# Altium footprint library PVV.PcbLib: 88 footprints (part 3 of 6)
Each footprint in its own frame and in the unit in brackets; x right, y up, seen from the top. Pads: shape width x height; smd on the part's side, far side on the other; paste and mask are expansions set on the pad; w line width, h text height; cw(c..) or ccw(c..) is an arc to the next point about the centre after c.
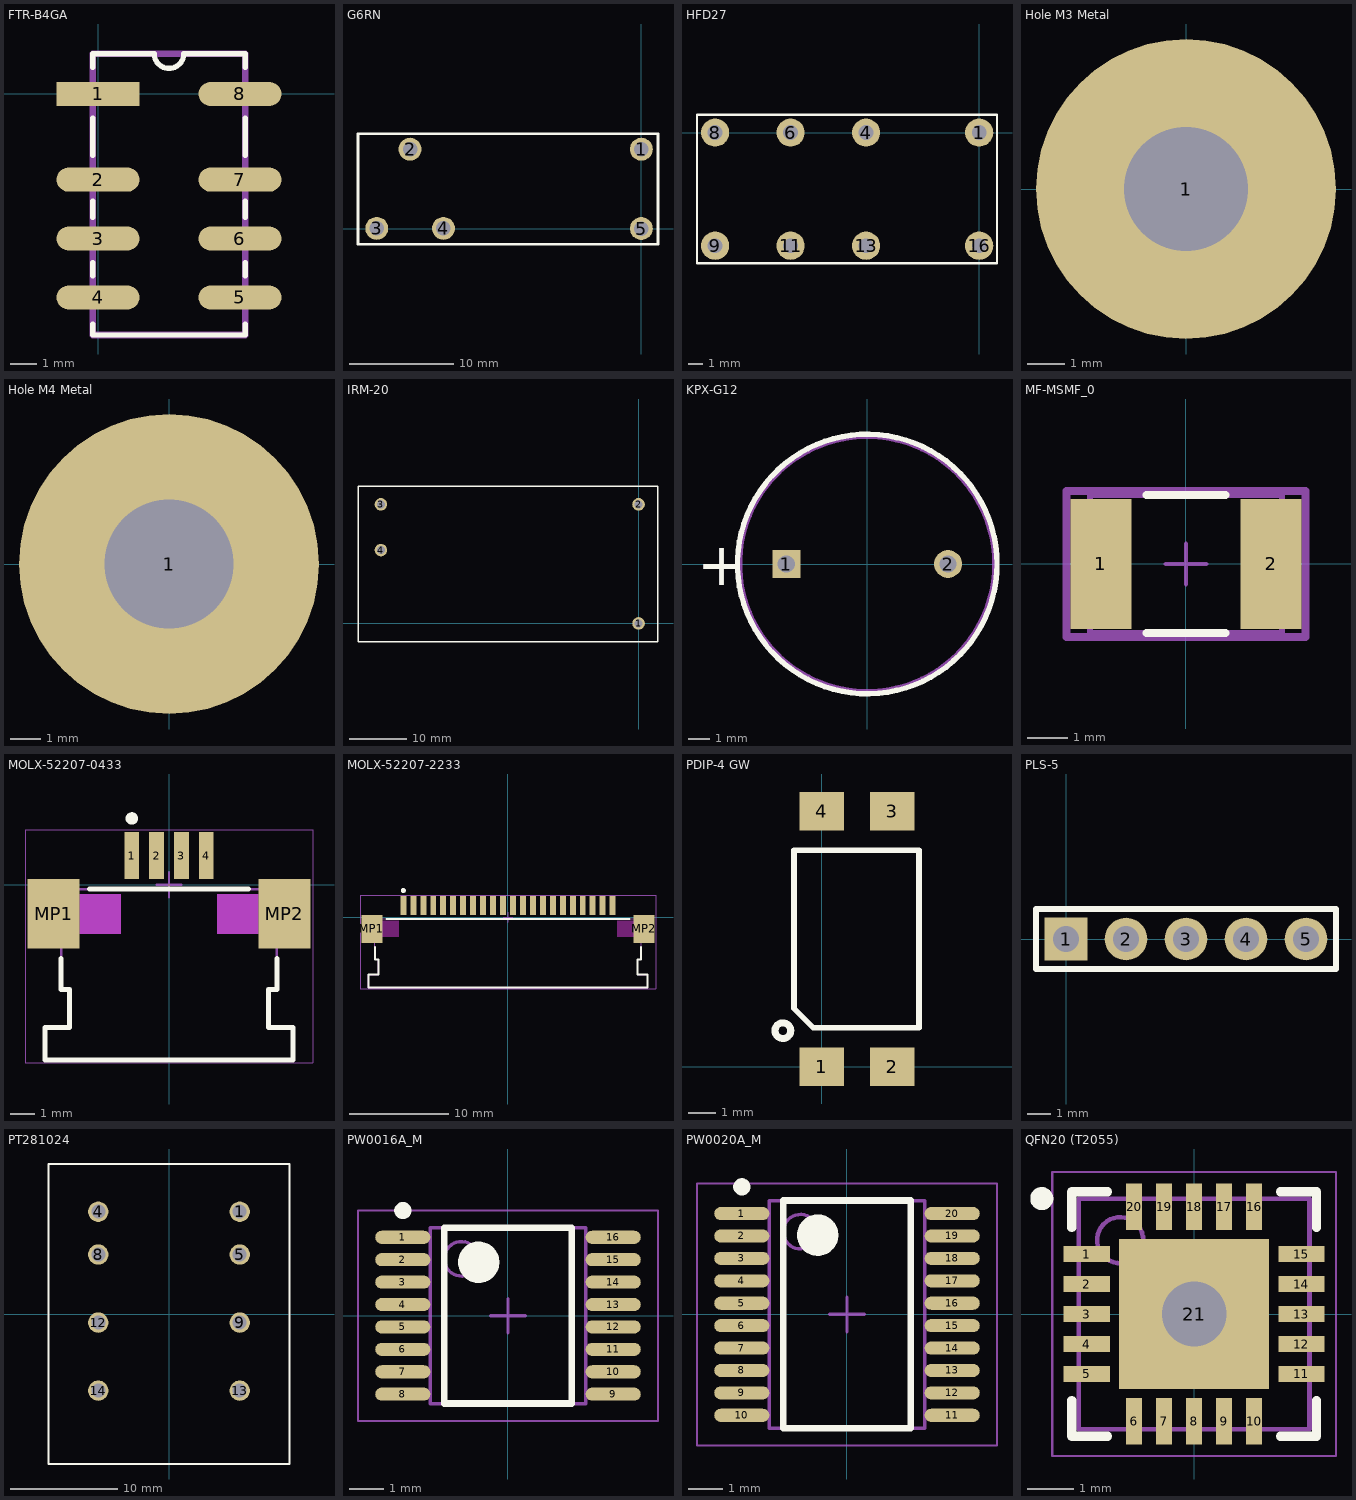
[diagram p2: the footprints below, top view; thin cyan lines are the x and y axes]

## FTR-B4GA [mm] "FTR-B4GA"
height 9.7
pads (8):
  rect 3.1x0.9 smd: 1(0,0)
  oval 3.1x0.9 smd: 2(0,-3.2) 3(0,-5.4) 4(0,-7.6) 5(5.3,-7.6) 6(5.3,-5.4) 7(5.3,-3.2) 8(5.3,0)
Top Overlay:
  lines w0.2: -0.2,-8.6 -0.2,-9 5.5,-9 5.5,-8.6 ; -0.2,-6.8 -0.2,-6.3 ; -0.2,-4.6 -0.2,-4 ; -0.2,-2.3 -0.2,-0.9 ; -0.2,1 -0.2,1.5 2.1,1.5 ccw(c2.65,1.5) 3.2,1.5 5.5,1.5 5.5,1 ; 5.5,-6.8 5.5,-6.3 ; 5.5,-4.6 5.5,-4 ; 5.5,-2.3 5.5,-0.9
Mechanical 13:
  lines w0.254: -0.2,-9 -0.2,1.5 5.5,1.5 5.5,-9 -0.2,-9
3D body: height 9.7, standoff 0, extent -0.199,-8.999 5.499,1.499

## G6RN [mm]
pads (5):
  round 2.2 hole 1.4: 1(0,7.62) 2(-22.2,7.62) 3(-25.4,0.02) 4(-19,0.02) 5(0,0)
Top Overlay:
  lines w0.254: -27.2,-1.5 -27.2,9.1 1.6,9.1 1.6,-1.5 -27.2,-1.5
3D body "User Library-Omron_G6RN-1-5DC_relay.step": height 15.31, standoff -3.49, extent -27.2,-1.44 1.6,9.06

## HFD27 [mm]
pads (8):
  round 1.9 hole 1: 1(0,0) 4(-7.62,0) 6(-12.7,0) 8(-17.78,0) 9(-17.78,-7.62) 11(-12.7,-7.62) 13(-7.62,-7.62) 16(0,-7.62)
Top Overlay:
  lines w0.152: -19,-8.8 1.2,-8.8 1.2,1.2 -19,1.2 -19,-8.8
3D body "SW3dPS-HFD27.STEP": height 11.52, standoff -3.09, extent -18.98,-8.81 1.22,1.19

## Hole M3 Metal [mm] "Hole 3.3 metal 8"
pads (1):
  round 8 hole 3.3: 1(0,0)

## Hole M4 Metal [mm] "Hole 4.3 metal 10"
pads (1):
  round 10 hole 4.3: 1(0,0)

## IRM-20 [mm] "20W PCB"
pads (4):
  round 2.2 hole 1.4: 1(0,0) 2(0,20.8) 3(-45,20.8) 4(-45,12.8)
Top Overlay:
  lines w0.254: -49,-3.2 -48.975,-3.225 3.4,-3.225 3.4,23.975 -49,23.975 -49,-3.2
3D body "User Library-IRM-20.step": height 24.01, standoff -3.49, extent -48.986,-3.214 3.414,23.986

## KPX-G12 [mil]
height 295.28
pads (2):
  rect 52x52 hole 32: 1(-149.61,0)
  round 52 hole 32: 2(149.61,0)
Top Overlay:
  circle w10: c0,0 r240.16
  text "+" at -314.96,-39.37 h78.74
Mechanical 13:
  circle w10: c0,0 r236.22
3D body: height 295.28, standoff 0, extent -236.2,-236.2 236.2,236.2

## MF-MSMF_0 [mm]
pads (2):
  rect 1.5x3.2 smd paste+0 mask+0: 1(-2.1,0) 2(2.1,0)
Top Overlay:
  lines w0.2: -0.975,-1.705 0.975,-1.705 ; -0.975,1.705 0.975,1.705
Mechanical 10:
  lines w0.2: -2.95,-1.805 -2.95,1.805 2.95,1.805 2.95,-1.805 -2.95,-1.805
  text ".Designator" at 0,0 h1
Mechanical 12:
  lines w0.15: -2.365,-1.705 -2.365,1.705 2.365,1.705 2.365,-1.705 -2.365,-1.705
Mechanical 15:
  lines w0.1: -0.5,0 0.5,0 ; 0,-0.5 0,0.5
  lines w0.2: -2.95,-1.805 -2.95,1.805 2.95,1.805 2.95,-1.805 -2.95,-1.805
3D body "Fuse_Bourns_MF-MSMF075-2_eec.STEP": height 0.25, standoff 0, extent -2.95,-1.805 2.95,1.805

## MOLX-52207-0433 [mm] "FPC Connector, 4-Leads, Right Angle, Pitch 1.0 mm, Mated Height 2.7 mm, SMT"
height 2.712
pads (6):
  rect 0.6x1.9 smd: 1(-1.5,1.175) 2(-0.5,1.175) 3(0.5,1.175) 4(1.5,1.175)
  rect 2.1x2.8 smd: MP1(-4.65,-1.175) MP2(4.65,-1.175)
Top Overlay:
  circle w0.25: c-1.5,2.675 r0.125
  lines w0.2: -4.35,-2.975 -4.35,-4.225 ; -3.2,-0.175 3.2,-0.175 ; 4.35,-2.975 4.35,-4.225 ; -4.35,-4.225 -4.35,-4.225 ; -4.35,-4.225 -4.013,-4.225 -4.012,-4.225 -4.012,-5.765 -5,-5.765 -5,-7.075 5,-7.075 5,-5.765 4.012,-5.765 4.012,-4.225 4.013,-4.225 4.35,-4.225 ; 4.35,-4.225 4.35,-4.225
Mechanical 13:
  lines w0.1: -5.15,-2.175 -4.35,-2.175 -4.35,-4.225 -4.012,-4.225 -4.012,-5.765 -5,-5.765 -5,-7.075 5,-7.075 5,-5.765 4.012,-5.765 4.012,-4.225 4.35,-4.225 4.35,-2.175 5.15,-2.175 5.15,-0.175 -5.15,-0.175 -5.15,-2.175
Mechanical 13 keep-out:
  region: -3.6,-0.375 -1.95,-0.375 -1.95,-1.975 -3.6,-1.975
  region: 3.6,-0.375 1.95,-0.375 1.95,-1.975 3.6,-1.975
Mechanical 15:
  lines w0.05: -5.8,-7.175 5.8,-7.175 5.8,2.225 -5.8,2.225 -5.8,-7.175
  lines w0.1: -0.5,0 0.5,0 ; 0,-0.5 0,0.5
3D body "522070433.stp": height 2.71, standoff 0.01, extent -5.15,-7.075 5.15,1.825

## MOLX-52207-2233 [mm] "FPC Connector, 22-Leads, Right Angle, Pitch 1.0 mm, Mated Height 2.7 mm, SMT"
height 2.712
pads (24):
  rect 0.6x1.9 smd: 1(-10.5,1.175) 2(-9.5,1.175) 3(-8.5,1.175) 4(-7.5,1.175) 5(-6.5,1.175) 6(-5.5,1.175) 7(-4.5,1.175) 8(-3.5,1.175) 9(-2.5,1.175) 10(-1.5,1.175) 11(-0.5,1.175) 12(0.5,1.175) 13(1.5,1.175) 14(2.5,1.175) 15(3.5,1.175) 16(4.5,1.175) 17(5.5,1.175) 18(6.5,1.175) 19(7.5,1.175) 20(8.5,1.175) 21(9.5,1.175) 22(10.5,1.175)
  rect 2.1x2.8 smd: MP1(-13.65,-1.175) MP2(13.65,-1.175)
Top Overlay:
  circle w0.25: c-10.5,2.675 r0.125
  lines w0.2: -13.35,-2.975 -13.35,-4.225 -13.013,-4.225 -13.012,-5.765 -14,-5.765 -14,-7.075 14,-7.075 14,-5.765 13.012,-5.765 13.012,-4.225 13.35,-4.225 13.35,-2.975 ; -12.2,-0.175 12.2,-0.175
Keep-Out Layer:
  region: -12.6,-0.375 -10.95,-0.375 -10.95,-1.975 -12.6,-1.975
  region: 12.6,-0.375 10.95,-0.375 10.95,-1.975 12.6,-1.975
Mechanical 13:
  lines w0.1: -14.15,-2.175 -13.35,-2.175 -13.35,-4.225 -13.012,-4.225 -13.012,-5.765 -14,-5.765 -14,-7.075 14,-7.075 14,-5.765 13.012,-5.765 13.012,-4.225 13.35,-4.225 13.35,-2.175 14.15,-2.175 14.15,-0.175 -14.15,-0.175 -14.15,-2.175
Mechanical 15:
  lines w0.05: -14.8,-7.175 14.8,-7.175 14.8,2.225 -14.8,2.225 -14.8,-7.175
  lines w0.1: -0.5,0 0.5,0 ; 0,-0.5 0,0.5
3D body "522072233.stp": height 2.71, standoff 0.01, extent -14.15,-7.075 14.15,1.825

## PDIP-4 GW [mm] "PDIP-4 GW"
pads (4):
  rect 1.6x1.4 smd: 1(0,0) 2(2.54,0) 3(2.54,9.2) 4(0,9.2)
Top Overlay:
  circle w0.254: c-1.4,1.3 r0.283
  lines w0.2: -1,2.1 -1,7.8 3.5,7.8 3.5,1.4 -0.3,1.4 -1,2.1
3D body "ALSRobot-KB817-B.step": height 3.83, standoff 0.01, extent -1.02,-0.34 3.56,9.54

## PLS-5 [mm]
pads (5):
  rect 1.8x1.8 hole 1.1: 1(0,0)
  round 1.8 hole 1.1: 2(2.54,0) 3(5.08,0) 4(7.62,0) 5(10.16,0)
Top Overlay:
  lines w0.254: -1.27,-1.27 11.43,-1.27 11.43,1.27 -1.27,1.27 -1.27,-1.27
3D body "022284050.stp": height 8.39, standoff -3.17, extent -1.27,-1.245 11.43,1.245

## PT281024 [mm] "PT281024"
pads (8):
  round 1.9 hole 1.3: 1(6.6,9.55) 4(-6.6,9.55) 5(6.6,5.55) 8(-6.6,5.55) 9(6.6,-0.8) 12(-6.6,-0.8) 13(6.6,-7.15) 14(-6.6,-7.15)
Top Overlay:
  lines w0.152: -11.25,-14 11.25,-14 11.25,14 -11.25,14 -11.25,-14
3D body "c-5-1419111-3-99-3d.stp": height 30.11, standoff -4.09, extent -11.25,-14 11.25,14

## PW0016A_M [mm] "TSSOP (R-PDSO-G16), 16-Leads, Body 5.1x4.5mm, Pitch 0.65mm"
height 1.2
pads (16):
  oval 1.6x0.38 smd: 1(-3.05,2.275) 2(-3.05,1.625) 3(-3.05,0.975) 4(-3.05,0.325) 5(-3.05,-0.325) 6(-3.05,-0.975) 7(-3.05,-1.625) 8(-3.05,-2.275) 9(3.05,-2.275) 10(3.05,-1.625) 11(3.05,-0.975) 12(3.05,-0.325) 13(3.05,0.325) 14(3.05,0.975) 15(3.05,1.625) 16(3.05,2.275)
Top Overlay:
  circle w0.25: c-3.05,3.05 r0.125
  circle w0.6: c-0.85,1.55 r0.3
  lines w0.2: -1.85,-2.55 -1.85,2.55 1.85,2.55 1.85,-2.55 -1.85,-2.55
Mechanical 13:
  circle w0.1: c-1.35,1.65 r0.5
  lines w0.1: -2.25,-2.55 -2.25,2.55 2.25,2.55 2.25,-2.55 -2.25,-2.55
Mechanical 15:
  lines w0.05: -4.35,-3.05 -4.35,3.05 4.35,3.05 4.35,-3.05 -4.35,-3.05
  lines w0.1: -0.5,0 0.5,0 ; 0,-0.5 0,0.5
3D body "PW0016AakaMTC16.stp": height 1.2, standoff 0, extent -3.21,-2.5 3.21,2.5

## PW0020A_M [mm] "SOP, 20-Leads, Body 6.6x4.5mm, Pitch 0.65mm, IPC Low Density"
height 1.2
pads (20):
  oval 1.6x0.38 smd: 1(-3.05,2.925) 2(-3.05,2.275) 3(-3.05,1.625) 4(-3.05,0.975) 5(-3.05,0.325) 6(-3.05,-0.325) 7(-3.05,-0.975) 8(-3.05,-1.625) 9(-3.05,-2.275) 10(-3.05,-2.925) 11(3.05,-2.925) 12(3.05,-2.275) 13(3.05,-1.625) 14(3.05,-0.975) 15(3.05,-0.325) 16(3.05,0.325) 17(3.05,0.975) 18(3.05,1.625) 19(3.05,2.275) 20(3.05,2.925)
Top Overlay:
  circle w0.25: c-3.05,3.7 r0.125
  circle w0.6: c-0.85,2.3 r0.3
  lines w0.2: -1.85,-3.3 -1.85,3.3 1.85,3.3 1.85,-3.3 -1.85,-3.3
Mechanical 13:
  circle w0.1: c-1.35,2.4 r0.5
  lines w0.1: -2.25,-3.3 -2.25,3.3 2.25,3.3 2.25,-3.3 -2.25,-3.3
Mechanical 15:
  lines w0.05: -4.35,-3.8 -4.35,3.8 4.35,3.8 4.35,-3.8 -4.35,-3.8
  lines w0.1: -0.5,0 0.5,0 ; 0,-0.5 0,0.5
3D body "PW0020AakaMTC20.stp": height 1.2, standoff 0, extent -3.21,-3.25 3.21,3.25

## QFN20 (T2055) [mm] "QFN, 20-Leads, Body 5,00x5,00mm, Pitch 0,65mm, Thermal Pad 3,25x3,25mm, IPC Medium Density"
height 0.8
pads (21):
  rect 1x0.35 smd: 1(-2.325,1.3) 2(-2.325,0.65) 3(-2.325,0) 4(-2.325,-0.65) 5(-2.325,-1.3) 11(2.325,-1.3) 12(2.325,-0.65) 13(2.325,0) 14(2.325,0.65) 15(2.325,1.3)
  rect 0.35x1 smd: 6(-1.3,-2.325) 7(-0.65,-2.325) 8(0,-2.325) 9(0.65,-2.325) 10(1.3,-2.325) 16(1.3,2.325) 17(0.65,2.325) 18(0,2.325) 19(-0.65,2.325) 20(-1.3,2.325)
  rect 3.25x3.25 smd: 21(0,0)
via 0,0 diameter 2 hole 1.4
Top Overlay:
  circle w0.25: c-3.3,2.5 r0.125
  lines w0.2: -2.65,-1.875 -2.65,-2.65 -1.875,-2.65 ; -2.65,1.875 -2.65,2.65 -1.875,2.65 ; 1.875,-2.65 2.65,-2.65 2.65,-1.875 ; 1.875,2.65 2.65,2.65 2.65,1.875
Mechanical 13:
  circle w0.1: c-1.6,1.6 r0.5
  lines w0.1: -2.5,-2.5 2.5,-2.5 2.5,2.5 -2.5,2.5 -2.5,-2.5
Mechanical 15:
  lines w0.05: -3.075,-3.075 3.075,-3.075 3.075,3.075 -3.075,3.075 -3.075,-3.075
  lines w0.1: 0,-0.5 0,0.5
3D body "QFN65P500X500X80_HS-21N.step": height 0.8, standoff 0, extent -2.501,-2.501 2.501,2.501